# Altium schematic symbol library jlcpcb_2025_04_capacitors_extended_0603.schlib: 3668 symbols (part 6 of 20) (continued)
## AM03CG300J500NT
designator C?  Capacitance: 30pF  (hidden comment: *)
Capacitor, Ceramic (MLCC), 30pF, ±5%, 50V, C0G, ±5%, SMD 0603; Manufacturer: FH (Guangdong Fenghua Advanced Tech); Manufacturer Part Number: AM03CG300J500NT; Package Size: 0603; JLCPCB Basic Part: No; JLCPCB Part Number: C2991604; Supplier 1: LCSC; Category: Capacitors - MLCC; Supplier Part Number 1: C2991604; Tolerance: ±5%; Voltage Rating: 50V; Temperature Coefficient: C0G; RoHS: Yes; ComponentLink1Description: Datasheet; ComponentLink1URL: https://wmsc.lcsc.com/wmsc/upload/file/pdf/v2/lcsc/2205171800_FH--Guangdong-Fenghua-Advanced-Tech-AM03CG300J500NT_C2991604.pdf; ComponentLink2Description: JLCPCB Part URL; ComponentLink2URL: https://jlcpcb.com/partdetail/C2991604; ComponentLink3Description: LCSC Part URL; ComponentLink3URL: https://lcsc.com/product-detail/Multilayer-Ceramic-Capacitors-MLCC---SMD-SMT_FH-Guangdong-Fenghua-Advanced-Tech-FH-Guangdong-Fenghua-Advanced-Tech-AM03CG300J500NT_C2991604.html
footprint CAP-0603 (0603 (1608M) Capacitor)
pins: 1, 2

## AMK107BBJ226MAHT
designator C?  Capacitance: 22uF  (hidden comment: *)
Capacitor, Ceramic (MLCC), 22uF, ±20%, 4V, X5R, ±20%, SMD 0603; Manufacturer: Taiyo Yuden; Manufacturer Part Number: AMK107BBJ226MAHT; Package Size: 0603; JLCPCB Basic Part: No; JLCPCB Part Number: C650960; Supplier 1: LCSC; Category: Capacitors - MLCC; Supplier Part Number 1: C650960; Tolerance: ±20%; Voltage Rating: 4V; Temperature Coefficient: X5R; RoHS: Yes; ComponentLink1Description: Datasheet; ComponentLink1URL: https://wmsc.lcsc.com/wmsc/upload/file/pdf/v2/lcsc/2211282200_Taiyo-Yuden-AMK107BBJ226MAHT_C650960.pdf; ComponentLink2Description: JLCPCB Part URL; ComponentLink2URL: https://jlcpcb.com/partdetail/C650960; ComponentLink3Description: LCSC Part URL; ComponentLink3URL: https://lcsc.com/product-detail/Multilayer-Ceramic-Capacitors-MLCC---SMD-SMT_Taiyo-Yuden-Taiyo-Yuden-AMK107BBJ226MAHT_C650960.html
footprint CAP-0603 (0603 (1608M) Capacitor)
pins: 1, 2

## AMK107BBJ476MA-RE
designator C?  Capacitance: 47uF  (hidden comment: *)
Capacitor, Ceramic (MLCC), 47uF, ±20%, 4V, X5R, ±20%, SMD 0603; Manufacturer: Taiyo Yuden; Manufacturer Part Number: AMK107BBJ476MA-RE; Package Size: 0603; JLCPCB Basic Part: No; JLCPCB Part Number: C2176082; Supplier 1: LCSC; Category: Capacitors - MLCC; Supplier Part Number 1: C2176082; Tolerance: ±20%; Voltage Rating: 4V; Temperature Coefficient: X5R; RoHS: Yes; ComponentLink1Description: Datasheet; ComponentLink1URL: https://wmsc.lcsc.com/wmsc/upload/file/pdf/v2/lcsc/2309051422_Taiyo-Yuden-AMK107BBJ476MA-RE_C2176082.pdf; ComponentLink2Description: JLCPCB Part URL; ComponentLink2URL: https://jlcpcb.com/partdetail/C2176082; ComponentLink3Description: LCSC Part URL; ComponentLink3URL: https://lcsc.com/product-detail/Multilayer-Ceramic-Capacitors-MLCC---SMD-SMT_Taiyo-Yuden-Taiyo-Yuden-AMK107BBJ476MA-RE_C2176082.html
footprint CAP-0603 (0603 (1608M) Capacitor)
pins: 1, 2

## AMK107BC6226MA-T
designator C?  Capacitance: 22uF  (hidden comment: *)
Capacitor, Ceramic (MLCC), 22uF, ±20%, 4V, X6S, ±20%, SMD 0603; Manufacturer: Taiyo Yuden; Manufacturer Part Number: AMK107BC6226MA-T; Package Size: 0603; JLCPCB Basic Part: No; JLCPCB Part Number: C412620; Supplier 1: LCSC; Category: Capacitors - MLCC; Supplier Part Number 1: C412620; Tolerance: ±20%; Voltage Rating: 4V; Temperature Coefficient: X6S; RoHS: Yes; ComponentLink1Description: Datasheet; ComponentLink1URL: https://wmsc.lcsc.com/wmsc/upload/file/pdf/v2/lcsc/1912111437_Taiyo-Yuden-AMK107BC6226MA-T_C412620.pdf; ComponentLink2Description: JLCPCB Part URL; ComponentLink2URL: https://jlcpcb.com/partdetail/C412620; ComponentLink3Description: LCSC Part URL; ComponentLink3URL: https://lcsc.com/product-detail/Multilayer-Ceramic-Capacitors-MLCC---SMD-SMT_Taiyo-Yuden-Taiyo-Yuden-AMK107BC6226MA-T_C412620.html
footprint CAP-0603 (0603 (1608M) Capacitor)
pins: 1, 2

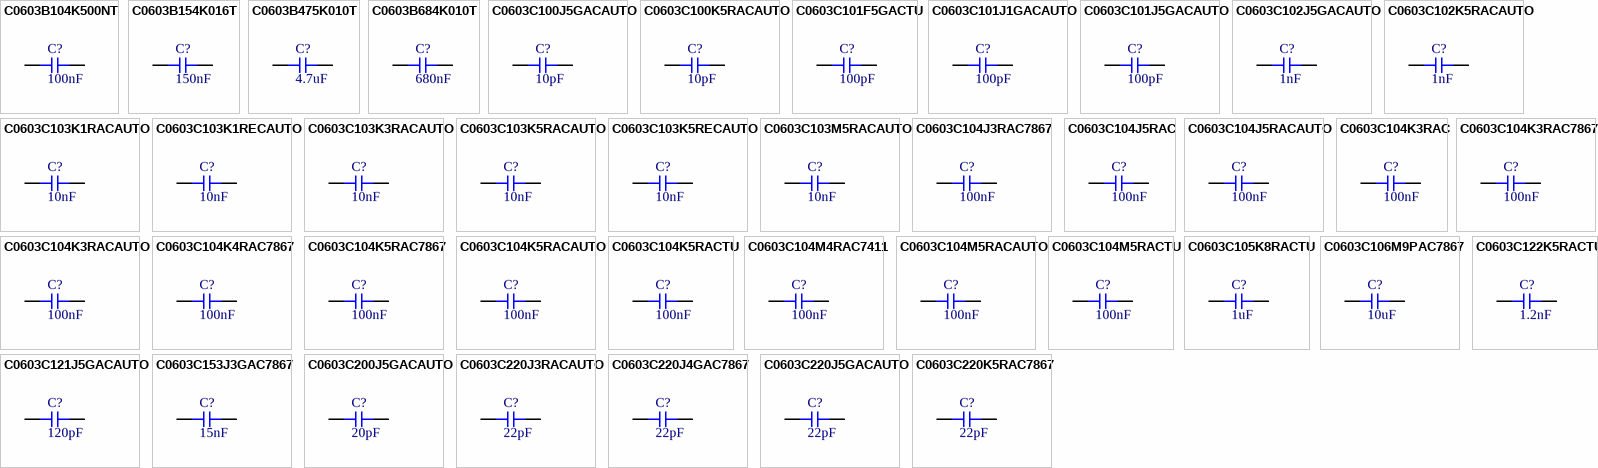
[diagram p27: symbols C0603B104K500NT to C0603C220K5RAC7867]

## C0603B104K500NT
designator C?  Capacitance: 100nF  (hidden comment: *)
Capacitor, Ceramic (MLCC), 100nF, ±10%, 50V, X7R, ±10%, SMD 0603; Manufacturer: TORCH; Manufacturer Part Number: C0603B104K500NT; Package Size: 0603; JLCPCB Basic Part: No; JLCPCB Part Number: C478888; Supplier 1: LCSC; Category: Capacitors - MLCC; Supplier Part Number 1: C478888; Tolerance: ±10%; Voltage Rating: 50V; Temperature Coefficient: X7R; RoHS: Yes; ComponentLink1Description: Datasheet; ComponentLink1URL: https://wmsc.lcsc.com/wmsc/upload/file/pdf/v2/lcsc/2003171533_TORCH-C0603B104K500NT_C478888.pdf; ComponentLink2Description: JLCPCB Part URL; ComponentLink2URL: https://jlcpcb.com/partdetail/C478888; ComponentLink3Description: LCSC Part URL; ComponentLink3URL: https://lcsc.com/product-detail/Multilayer-Ceramic-Capacitors-MLCC---SMD-SMT_TORCH-TORCH-C0603B104K500NT_C478888.html
footprint CAP-0603 (0603 (1608M) Capacitor)
pins: 1, 2

## C0603B154K016T
designator C?  Capacitance: 150nF  (hidden comment: *)
Capacitor, Ceramic (MLCC), 150nF, ±10%, 16V, X5R, ±10%, SMD 0603; Manufacturer: IHHEC(HOLY STONE ENTERPRISE CO., LTD); Manufacturer Part Number: C0603B154K016T; Package Size: 0603; JLCPCB Basic Part: No; JLCPCB Part Number: C961502; Supplier 1: LCSC; Category: Capacitors - MLCC; Supplier Part Number 1: C961502; Tolerance: ±10%; Voltage Rating: 16V; Temperature Coefficient: X5R; RoHS: Yes; ComponentLink1Description: Datasheet; ComponentLink1URL: https://wmsc.lcsc.com/wmsc/upload/file/pdf/v2/lcsc/2304140030_IHHEC-HOLY-STONE-ENTERPRISE-CO---LTD-C0603B154K016T_C961502.pdf; ComponentLink2Description: JLCPCB Part URL; ComponentLink2URL: https://jlcpcb.com/partdetail/C961502; ComponentLink3Description: LCSC Part URL; ComponentLink3URL: https://lcsc.com/product-detail/Multilayer-Ceramic-Capacitors-MLCC---SMD-SMT_IHHECHOLY-STONE-ENTERPRISE-CO.%2C-LTD-IHHECHOLY-STONE-ENTERPRISE-CO.%2C-LTD-C0603B154K016T_C961502.html
footprint CAP-0603 (0603 (1608M) Capacitor)
pins: 1, 2

## C0603B475K010T
designator C?  Capacitance: 4.7uF  (hidden comment: *)
Capacitor, Ceramic (MLCC), 4.7uF, ±10%, 10V, X5R, ±10%, SMD 0603; Manufacturer: IHHEC(HOLY STONE ENTERPRISE CO., LTD); Manufacturer Part Number: C0603B475K010T; Package Size: 0603; JLCPCB Basic Part: No; JLCPCB Part Number: C961503; Supplier 1: LCSC; Category: Capacitors - MLCC; Supplier Part Number 1: C961503; Tolerance: ±10%; Voltage Rating: 10V; Temperature Coefficient: X5R; RoHS: Yes; ComponentLink1Description: Datasheet; ComponentLink1URL: https://wmsc.lcsc.com/wmsc/upload/file/pdf/v2/lcsc/2304140030_IHHEC-HOLY-STONE-ENTERPRISE-CO---LTD-C0603B475K010T_C961503.pdf; ComponentLink2Description: JLCPCB Part URL; ComponentLink2URL: https://jlcpcb.com/partdetail/C961503; ComponentLink3Description: LCSC Part URL; ComponentLink3URL: https://lcsc.com/product-detail/Multilayer-Ceramic-Capacitors-MLCC---SMD-SMT_IHHECHOLY-STONE-ENTERPRISE-CO.%2C-LTD-IHHECHOLY-STONE-ENTERPRISE-CO.%2C-LTD-C0603B475K010T_C961503.html
footprint CAP-0603 (0603 (1608M) Capacitor)
pins: 1, 2

## C0603B684K010T
designator C?  Capacitance: 680nF  (hidden comment: *)
Capacitor, Ceramic (MLCC), 680nF, ±10%, 10V, X5R, ±10%, SMD 0603; Manufacturer: IHHEC(HOLY STONE ENTERPRISE CO., LTD); Manufacturer Part Number: C0603B684K010T; Package Size: 0603; JLCPCB Basic Part: No; JLCPCB Part Number: C961504; Supplier 1: LCSC; Category: Capacitors - MLCC; Supplier Part Number 1: C961504; Tolerance: ±10%; Voltage Rating: 10V; Temperature Coefficient: X5R; RoHS: Yes; ComponentLink1Description: Datasheet; ComponentLink1URL: https://wmsc.lcsc.com/wmsc/upload/file/pdf/v2/lcsc/2304140030_IHHEC-HOLY-STONE-ENTERPRISE-CO---LTD-C0603B684K010T_C961504.pdf; ComponentLink2Description: JLCPCB Part URL; ComponentLink2URL: https://jlcpcb.com/partdetail/C961504; ComponentLink3Description: LCSC Part URL; ComponentLink3URL: https://lcsc.com/product-detail/Multilayer-Ceramic-Capacitors-MLCC---SMD-SMT_IHHECHOLY-STONE-ENTERPRISE-CO.%2C-LTD-IHHECHOLY-STONE-ENTERPRISE-CO.%2C-LTD-C0603B684K010T_C961504.html
footprint CAP-0603 (0603 (1608M) Capacitor)
pins: 1, 2

## C0603C100J5GACAUTO
designator C?  Capacitance: 10pF  (hidden comment: *)
Capacitor, Ceramic (MLCC), 10pF, ±5%, 50V, C0G, ±5%, SMD 0603; Manufacturer: KEMET; Manufacturer Part Number: C0603C100J5GACAUTO; Package Size: 0603; JLCPCB Basic Part: No; JLCPCB Part Number: C129620; Supplier 1: LCSC; Category: Capacitors - MLCC; Supplier Part Number 1: C129620; Tolerance: ±5%; Voltage Rating: 50V; Temperature Coefficient: C0G; RoHS: Yes; ComponentLink1Description: Datasheet; ComponentLink1URL: https://wmsc.lcsc.com/wmsc/upload/file/pdf/v2/lcsc/2304140030_KEMET-C0603C100J5GACAUTO_C129620.pdf; ComponentLink2Description: JLCPCB Part URL; ComponentLink2URL: https://jlcpcb.com/partdetail/C129620; ComponentLink3Description: LCSC Part URL; ComponentLink3URL: https://lcsc.com/product-detail/Multilayer-Ceramic-Capacitors-MLCC---SMD-SMT_KEMET-KEMET-C0603C100J5GACAUTO_C129620.html
footprint CAP-0603 (0603 (1608M) Capacitor)
pins: 1, 2

## C0603C100K5RACAUTO
designator C?  Capacitance: 10pF  (hidden comment: *)
Capacitor, Ceramic (MLCC), 10pF, ±10%, 50V, X7R, ±10%, SMD 0603; Manufacturer: KEMET; Manufacturer Part Number: C0603C100K5RACAUTO; Package Size: 0603; JLCPCB Basic Part: No; JLCPCB Part Number: C2170082; Supplier 1: LCSC; Category: Capacitors - MLCC; Supplier Part Number 1: C2170082; Tolerance: ±10%; Voltage Rating: 50V; Temperature Coefficient: X7R; RoHS: Yes; ComponentLink1Description: Datasheet; ComponentLink1URL: https://wmsc.lcsc.com/wmsc/upload/file/pdf/v2/lcsc/2304140030_KEMET-C0603C100K5RACAUTO_C2170082.pdf; ComponentLink2Description: JLCPCB Part URL; ComponentLink2URL: https://jlcpcb.com/partdetail/C2170082; ComponentLink3Description: LCSC Part URL; ComponentLink3URL: https://lcsc.com/product-detail/Multilayer-Ceramic-Capacitors-MLCC---SMD-SMT_KEMET-KEMET-C0603C100K5RACAUTO_C2170082.html
footprint CAP-0603 (0603 (1608M) Capacitor)
pins: 1, 2

## C0603C101F5GACTU
designator C?  Capacitance: 100pF  (hidden comment: *)
Capacitor, Ceramic (MLCC), 100pF, ±1%, 50V, C0G, ±1%, SMD 0603; Manufacturer: KEMET; Manufacturer Part Number: C0603C101F5GACTU; Package Size: 0603; JLCPCB Basic Part: No; JLCPCB Part Number: C2167591; Supplier 1: LCSC; Category: Capacitors - MLCC; Supplier Part Number 1: C2167591; Tolerance: ±1%; Voltage Rating: 50V; Temperature Coefficient: C0G; RoHS: Yes; ComponentLink1Description: Datasheet; ComponentLink1URL: https://wmsc.lcsc.com/wmsc/upload/file/pdf/v2/lcsc/2304140030_KEMET-C0603C101F5GACTU_C2167591.pdf; ComponentLink2Description: JLCPCB Part URL; ComponentLink2URL: https://jlcpcb.com/partdetail/C2167591; ComponentLink3Description: LCSC Part URL; ComponentLink3URL: https://lcsc.com/product-detail/Multilayer-Ceramic-Capacitors-MLCC---SMD-SMT_KEMET-KEMET-C0603C101F5GACTU_C2167591.html
footprint CAP-0603 (0603 (1608M) Capacitor)
pins: 1, 2

## C0603C101J1GACAUTO
designator C?  Capacitance: 100pF  (hidden comment: *)
Capacitor, Ceramic (MLCC), 100pF, ±5%, 100V, C0G, ±5%, SMD 0603; Manufacturer: KEMET; Manufacturer Part Number: C0603C101J1GACAUTO; Package Size: 0603; JLCPCB Basic Part: No; JLCPCB Part Number: C2171650; Supplier 1: LCSC; Category: Capacitors - MLCC; Supplier Part Number 1: C2171650; Tolerance: ±5%; Voltage Rating: 100V; Temperature Coefficient: C0G; RoHS: Yes; ComponentLink1Description: Datasheet; ComponentLink1URL: https://wmsc.lcsc.com/wmsc/upload/file/pdf/v2/lcsc/2304140030_KEMET-C0603C101J1GACAUTO_C2171650.pdf; ComponentLink2Description: JLCPCB Part URL; ComponentLink2URL: https://jlcpcb.com/partdetail/C2171650; ComponentLink3Description: LCSC Part URL; ComponentLink3URL: https://lcsc.com/product-detail/Multilayer-Ceramic-Capacitors-MLCC---SMD-SMT_KEMET-KEMET-C0603C101J1GACAUTO_C2171650.html
footprint CAP-0603 (0603 (1608M) Capacitor)
pins: 1, 2

## C0603C101J5GACAUTO
designator C?  Capacitance: 100pF  (hidden comment: *)
Capacitor, Ceramic (MLCC), 100pF, ±5%, 50V, C0G, ±5%, SMD 0603; Manufacturer: KEMET; Manufacturer Part Number: C0603C101J5GACAUTO; Package Size: 0603; JLCPCB Basic Part: No; JLCPCB Part Number: C561788; Supplier 1: LCSC; Category: Capacitors - MLCC; Supplier Part Number 1: C561788; Tolerance: ±5%; Voltage Rating: 50V; Temperature Coefficient: C0G; RoHS: Yes; ComponentLink1Description: Datasheet; ComponentLink1URL: https://wmsc.lcsc.com/wmsc/upload/file/pdf/v2/lcsc/2006181108_KEMET-C0603C101J5GACAUTO_C561788.pdf; ComponentLink2Description: JLCPCB Part URL; ComponentLink2URL: https://jlcpcb.com/partdetail/C561788; ComponentLink3Description: LCSC Part URL; ComponentLink3URL: https://lcsc.com/product-detail/Multilayer-Ceramic-Capacitors-MLCC---SMD-SMT_KEMET-KEMET-C0603C101J5GACAUTO_C561788.html
footprint CAP-0603 (0603 (1608M) Capacitor)
pins: 1, 2

## C0603C102J5GACAUTO
designator C?  Capacitance: 1nF  (hidden comment: *)
Capacitor, Ceramic (MLCC), 1nF, ±5%, 50V, C0G, ±5%, SMD 0603; Manufacturer: KEMET; Manufacturer Part Number: C0603C102J5GACAUTO; Package Size: 0603; JLCPCB Basic Part: No; JLCPCB Part Number: C599632; Supplier 1: LCSC; Category: Capacitors - MLCC; Supplier Part Number 1: C599632; Tolerance: ±5%; Voltage Rating: 50V; Temperature Coefficient: C0G; RoHS: Yes; ComponentLink1Description: Datasheet; ComponentLink1URL: https://wmsc.lcsc.com/wmsc/upload/file/pdf/v2/lcsc/2006181134_KEMET-C0603C102J5GACAUTO_C599632.pdf; ComponentLink2Description: JLCPCB Part URL; ComponentLink2URL: https://jlcpcb.com/partdetail/C599632; ComponentLink3Description: LCSC Part URL; ComponentLink3URL: https://lcsc.com/product-detail/Multilayer-Ceramic-Capacitors-MLCC---SMD-SMT_KEMET-KEMET-C0603C102J5GACAUTO_C599632.html
footprint CAP-0603 (0603 (1608M) Capacitor)
pins: 1, 2

## C0603C102K5RACAUTO
designator C?  Capacitance: 1nF  (hidden comment: *)
Capacitor, Ceramic (MLCC), 1nF, ±10%, 50V, X7R, ±10%, SMD 0603; Manufacturer: KEMET; Manufacturer Part Number: C0603C102K5RACAUTO; Package Size: 0603; JLCPCB Basic Part: No; JLCPCB Part Number: C141069; Supplier 1: LCSC; Category: Capacitors - MLCC; Supplier Part Number 1: C141069; Tolerance: ±10%; Voltage Rating: 50V; Temperature Coefficient: X7R; RoHS: Yes; ComponentLink1Description: Datasheet; ComponentLink1URL: https://wmsc.lcsc.com/wmsc/upload/file/pdf/v2/lcsc/2304140030_KEMET-C0603C102K5RACAUTO_C141069.pdf; ComponentLink2Description: JLCPCB Part URL; ComponentLink2URL: https://jlcpcb.com/partdetail/C141069; ComponentLink3Description: LCSC Part URL; ComponentLink3URL: https://lcsc.com/product-detail/Multilayer-Ceramic-Capacitors-MLCC---SMD-SMT_KEMET-KEMET-C0603C102K5RACAUTO_C141069.html
footprint CAP-0603 (0603 (1608M) Capacitor)
pins: 1, 2

## C0603C103K1RACAUTO
designator C?  Capacitance: 10nF  (hidden comment: *)
Capacitor, Ceramic (MLCC), 10nF, ±10%, 100V, X7R, ±10%, SMD 0603; Manufacturer: KEMET; Manufacturer Part Number: C0603C103K1RACAUTO; Package Size: 0603; JLCPCB Basic Part: No; JLCPCB Part Number: C141072; Supplier 1: LCSC; Category: Capacitors - MLCC; Supplier Part Number 1: C141072; Tolerance: ±10%; Voltage Rating: 100V; Temperature Coefficient: X7R; RoHS: Yes; ComponentLink1Description: Datasheet; ComponentLink1URL: https://wmsc.lcsc.com/wmsc/upload/file/pdf/v2/lcsc/2304140030_KEMET-C0603C103K1RACAUTO_C141072.pdf; ComponentLink2Description: JLCPCB Part URL; ComponentLink2URL: https://jlcpcb.com/partdetail/C141072; ComponentLink3Description: LCSC Part URL; ComponentLink3URL: https://lcsc.com/product-detail/Multilayer-Ceramic-Capacitors-MLCC---SMD-SMT_KEMET-KEMET-C0603C103K1RACAUTO_C141072.html
footprint CAP-0603 (0603 (1608M) Capacitor)
pins: 1, 2

## C0603C103K1RECAUTO
designator C?  Capacitance: 10nF  (hidden comment: *)
Capacitor, Ceramic (MLCC), 10nF, ±10%, 100V, X7R, ±10%, SMD 0603; Manufacturer: KEMET; Manufacturer Part Number: C0603C103K1RECAUTO; Package Size: 0603; JLCPCB Basic Part: No; JLCPCB Part Number: C696357; Supplier 1: LCSC; Category: Capacitors - MLCC; Supplier Part Number 1: C696357; Tolerance: ±10%; Voltage Rating: 100V; Temperature Coefficient: X7R; RoHS: Yes; ComponentLink1Description: Datasheet; ComponentLink1URL: https://wmsc.lcsc.com/wmsc/upload/file/pdf/v2/lcsc/2304140030_KEMET-C0603C103K1RECAUTO_C696357.pdf; ComponentLink2Description: JLCPCB Part URL; ComponentLink2URL: https://jlcpcb.com/partdetail/C696357; ComponentLink3Description: LCSC Part URL; ComponentLink3URL: https://lcsc.com/product-detail/Multilayer-Ceramic-Capacitors-MLCC---SMD-SMT_KEMET-KEMET-C0603C103K1RECAUTO_C696357.html
footprint CAP-0603 (0603 (1608M) Capacitor)
pins: 1, 2

## C0603C103K3RACAUTO
designator C?  Capacitance: 10nF  (hidden comment: *)
Capacitor, Ceramic (MLCC), 10nF, ±10%, 25V, X7R, ±10%, SMD 0603; Manufacturer: KEMET; Manufacturer Part Number: C0603C103K3RACAUTO; Package Size: 0603; JLCPCB Basic Part: No; JLCPCB Part Number: C141073; Supplier 1: LCSC; Category: Capacitors - MLCC; Supplier Part Number 1: C141073; Tolerance: ±10%; Voltage Rating: 25V; Temperature Coefficient: X7R; RoHS: Yes; ComponentLink1Description: Datasheet; ComponentLink1URL: https://wmsc.lcsc.com/wmsc/upload/file/pdf/v2/lcsc/2304140030_KEMET-C0603C103K3RACAUTO_C141073.pdf; ComponentLink2Description: JLCPCB Part URL; ComponentLink2URL: https://jlcpcb.com/partdetail/C141073; ComponentLink3Description: LCSC Part URL; ComponentLink3URL: https://lcsc.com/product-detail/Multilayer-Ceramic-Capacitors-MLCC---SMD-SMT_KEMET-KEMET-C0603C103K3RACAUTO_C141073.html
footprint CAP-0603 (0603 (1608M) Capacitor)
pins: 1, 2

## C0603C103K5RACAUTO
designator C?  Capacitance: 10nF  (hidden comment: *)
Capacitor, Ceramic (MLCC), 10nF, ±10%, 50V, X7R, ±10%, SMD 0603; Manufacturer: KEMET; Manufacturer Part Number: C0603C103K5RACAUTO; Package Size: 0603; JLCPCB Basic Part: No; JLCPCB Part Number: C141078; Supplier 1: LCSC; Category: Capacitors - MLCC; Supplier Part Number 1: C141078; Tolerance: ±10%; Voltage Rating: 50V; Temperature Coefficient: X7R; RoHS: Yes; ComponentLink1Description: Datasheet; ComponentLink1URL: https://wmsc.lcsc.com/wmsc/upload/file/pdf/v2/lcsc/2304140030_KEMET-C0603C103K5RACAUTO_C141078.pdf; ComponentLink2Description: JLCPCB Part URL; ComponentLink2URL: https://jlcpcb.com/partdetail/C141078; ComponentLink3Description: LCSC Part URL; ComponentLink3URL: https://lcsc.com/product-detail/Multilayer-Ceramic-Capacitors-MLCC---SMD-SMT_KEMET-KEMET-C0603C103K5RACAUTO_C141078.html
footprint CAP-0603 (0603 (1608M) Capacitor)
pins: 1, 2

## C0603C103K5RECAUTO
designator C?  Capacitance: 10nF  (hidden comment: *)
Capacitor, Ceramic (MLCC), 10nF, ±10%, 50V, X7R, ±10%, SMD 0603; Manufacturer: KEMET; Manufacturer Part Number: C0603C103K5RECAUTO; Package Size: 0603; JLCPCB Basic Part: No; JLCPCB Part Number: C2169432; Supplier 1: LCSC; Category: Capacitors - MLCC; Supplier Part Number 1: C2169432; Tolerance: ±10%; Voltage Rating: 50V; Temperature Coefficient: X7R; RoHS: Yes; ComponentLink1Description: Datasheet; ComponentLink1URL: https://wmsc.lcsc.com/wmsc/upload/file/pdf/v2/lcsc/2304140030_KEMET-C0603C103K5RECAUTO_C2169432.pdf; ComponentLink2Description: JLCPCB Part URL; ComponentLink2URL: https://jlcpcb.com/partdetail/C2169432; ComponentLink3Description: LCSC Part URL; ComponentLink3URL: https://lcsc.com/product-detail/Multilayer-Ceramic-Capacitors-MLCC---SMD-SMT_KEMET-KEMET-C0603C103K5RECAUTO_C2169432.html
footprint CAP-0603 (0603 (1608M) Capacitor)
pins: 1, 2

## C0603C103M5RACAUTO
designator C?  Capacitance: 10nF  (hidden comment: *)
Capacitor, Ceramic (MLCC), 10nF, ±20%, 50V, X7R, ±20%, SMD 0603; Manufacturer: KEMET; Manufacturer Part Number: C0603C103M5RACAUTO; Package Size: 0603; JLCPCB Basic Part: No; JLCPCB Part Number: C2180616; Supplier 1: LCSC; Category: Capacitors - MLCC; Supplier Part Number 1: C2180616; Tolerance: ±20%; Voltage Rating: 50V; Temperature Coefficient: X7R; RoHS: Yes; ComponentLink1Description: Datasheet; ComponentLink1URL: https://wmsc.lcsc.com/wmsc/upload/file/pdf/v2/lcsc/2202041130_KEMET-C0603C103M5RACAUTO_C2180616.pdf; ComponentLink2Description: JLCPCB Part URL; ComponentLink2URL: https://jlcpcb.com/partdetail/C2180616; ComponentLink3Description: LCSC Part URL; ComponentLink3URL: https://lcsc.com/product-detail/Multilayer-Ceramic-Capacitors-MLCC---SMD-SMT_KEMET-KEMET-C0603C103M5RACAUTO_C2180616.html
footprint CAP-0603 (0603 (1608M) Capacitor)
pins: 1, 2

## C0603C104J3RAC7867
designator C?  Capacitance: 100nF  (hidden comment: *)
Capacitor, Ceramic (MLCC), 100nF, ±5%, 25V, X7R, ±5%, SMD 0603; Manufacturer: KEMET; Manufacturer Part Number: C0603C104J3RAC7867; Package Size: 0603; JLCPCB Basic Part: No; JLCPCB Part Number: C599645; Supplier 1: LCSC; Category: Capacitors - MLCC; Supplier Part Number 1: C599645; Tolerance: ±5%; Voltage Rating: 25V; Temperature Coefficient: X7R; RoHS: Yes; ComponentLink1Description: Datasheet; ComponentLink1URL: https://wmsc.lcsc.com/wmsc/upload/file/pdf/v2/lcsc/2304140030_KEMET-C0603C104J3RAC7867_C599645.pdf; ComponentLink2Description: JLCPCB Part URL; ComponentLink2URL: https://jlcpcb.com/partdetail/C599645; ComponentLink3Description: LCSC Part URL; ComponentLink3URL: https://lcsc.com/product-detail/Multilayer-Ceramic-Capacitors-MLCC---SMD-SMT_KEMET-KEMET-C0603C104J3RAC7867_C599645.html
footprint CAP-0603 (0603 (1608M) Capacitor)
pins: 1, 2

## C0603C104J5RAC
designator C?  Capacitance: 100nF  (hidden comment: *)
Capacitor, Ceramic (MLCC), 100nF, ±5%, 50V, X7R, ±5%, SMD 0603; Manufacturer: KEMET; Manufacturer Part Number: C0603C104J5RAC; Package Size: 0603; JLCPCB Basic Part: No; JLCPCB Part Number: C490602; Supplier 1: LCSC; Category: Capacitors - MLCC; Supplier Part Number 1: C490602; Tolerance: ±5%; Voltage Rating: 50V; Temperature Coefficient: X7R; RoHS: Yes; ComponentLink1Description: Datasheet; ComponentLink1URL: https://wmsc.lcsc.com/wmsc/upload/file/pdf/v2/lcsc/2003060935_KEMET-C0603C104J5RAC_C490602.pdf; ComponentLink2Description: JLCPCB Part URL; ComponentLink2URL: https://jlcpcb.com/partdetail/C490602; ComponentLink3Description: LCSC Part URL; ComponentLink3URL: https://lcsc.com/product-detail/Multilayer-Ceramic-Capacitors-MLCC---SMD-SMT_KEMET-KEMET-C0603C104J5RAC_C490602.html
footprint CAP-0603 (0603 (1608M) Capacitor)
pins: 1, 2

## C0603C104J5RACAUTO
designator C?  Capacitance: 100nF  (hidden comment: *)
Capacitor, Ceramic (MLCC), 100nF, ±5%, 50V, X7R, ±5%, SMD 0603; Manufacturer: KEMET; Manufacturer Part Number: C0603C104J5RACAUTO; Package Size: 0603; JLCPCB Basic Part: No; JLCPCB Part Number: C172735; Supplier 1: LCSC; Category: Capacitors - MLCC; Supplier Part Number 1: C172735; Tolerance: ±5%; Voltage Rating: 50V; Temperature Coefficient: X7R; RoHS: Yes; ComponentLink1Description: Datasheet; ComponentLink1URL: https://wmsc.lcsc.com/wmsc/upload/file/pdf/v2/lcsc/2311211049_KEMET-C0603C104J5RACAUTO_C172735.pdf; ComponentLink2Description: JLCPCB Part URL; ComponentLink2URL: https://jlcpcb.com/partdetail/C172735; ComponentLink3Description: LCSC Part URL; ComponentLink3URL: https://lcsc.com/product-detail/Multilayer-Ceramic-Capacitors-MLCC---SMD-SMT_KEMET-KEMET-C0603C104J5RACAUTO_C172735.html
footprint CAP-0603 (0603 (1608M) Capacitor)
pins: 1, 2

## C0603C104K3RAC
designator C?  Capacitance: 100nF  (hidden comment: *)
Capacitor, Ceramic (MLCC), 100nF, ±10%, 25V, X7R, ±10%, SMD 0603; Manufacturer: KEMET; Manufacturer Part Number: C0603C104K3RAC; Package Size: 0603; JLCPCB Basic Part: No; JLCPCB Part Number: C513334; Supplier 1: LCSC; Category: Capacitors - MLCC; Supplier Part Number 1: C513334; Tolerance: ±10%; Voltage Rating: 25V; Temperature Coefficient: X7R; RoHS: Yes; ComponentLink1Description: Datasheet; ComponentLink1URL: https://wmsc.lcsc.com/wmsc/upload/file/pdf/v2/lcsc/2004201509_KEMET-C0603C104K3RAC_C513334.pdf; ComponentLink2Description: JLCPCB Part URL; ComponentLink2URL: https://jlcpcb.com/partdetail/C513334; ComponentLink3Description: LCSC Part URL; ComponentLink3URL: https://lcsc.com/product-detail/Multilayer-Ceramic-Capacitors-MLCC---SMD-SMT_KEMET-KEMET-C0603C104K3RAC_C513334.html
footprint CAP-0603 (0603 (1608M) Capacitor)
pins: 1, 2